# Altium footprint library qfuse_pcb_lib.PcbLib: 37 footprints (part 3 of 3)
Each footprint in its own frame and in the unit in brackets; x right, y up, seen from the top. Pads: shape width x height; smd on the part's side, far side on the other; paste and mask are expansions set on the pad; w line width, h text height; cw(c..) or ccw(c..) is an arc to the next point about the centre after c.
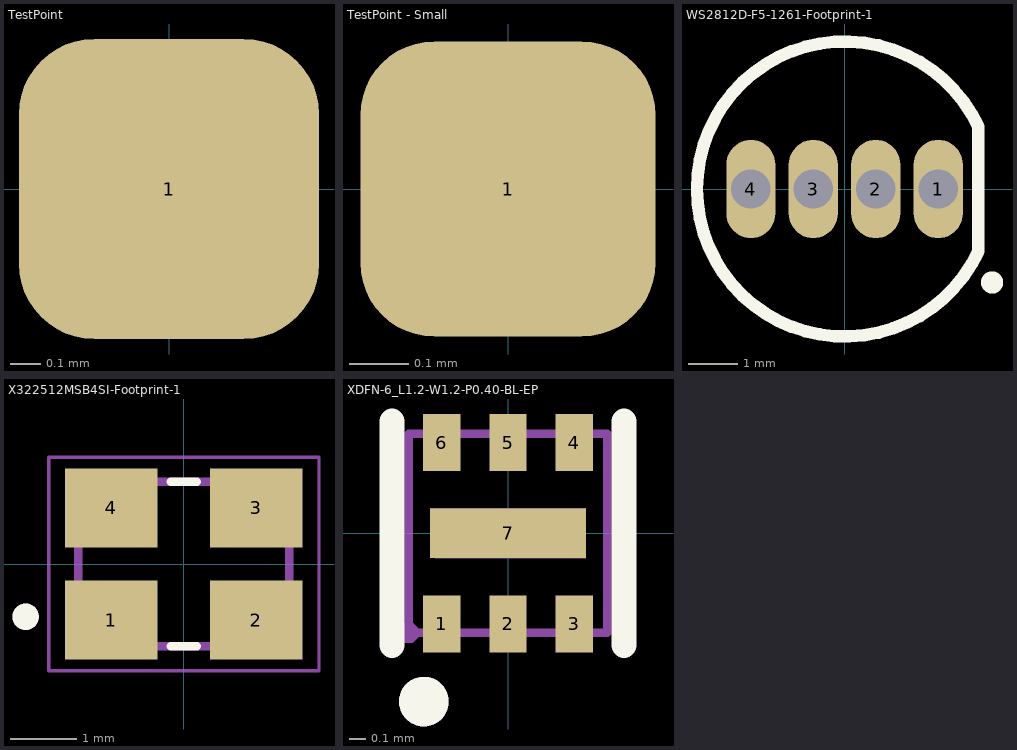
[diagram p2: the footprints below, top view; thin cyan lines are the x and y axes]

## TestPoint [mm]
pads (1):
  rrect50% 1x1 smd: 1(0,0)

## TestPoint - Small [mm]
pads (1):
  rrect50% 0.5x0.5 smd: 1(0,0)

## WS2812D-F5-1261-Footprint-1 [mm]
pads (4):
  oval 1x2 hole 0.8: 1(1.905,0) 2(0.635,0) 3(-0.635,0) 4(-1.905,0)
Top Overlay:
  circle w0.254: c3,-1.9 r0.1
  lines w0.254: 2.719,-1.268 cw(c0,0) 2.719,1.268 2.719,-1.268
Top Solder:
  rectangle: -2.259,-0.854 2.259,0.854
3D body "CA GRB LED 5mm.STEP": height 8.6, standoff -25.6, extent -2.75,-2.75 2.375,2.75

## X322512MSB4SI-Footprint-1 [mm]
pads (4):
  rect 1.4x1.2 smd: 1(-1.1,-0.85) 2(1.1,-0.85) 3(1.1,0.85) 4(-1.1,0.85)
Top Overlay:
  circle w0.2: c-2.4,-0.8 r0.1
  lines w0.127: -0.2,-1.25 0.2,-1.25 ; -0.2,1.25 0.2,1.25
Mechanical 13:
  circle w0.2: c-2.4,-0.8 r0.1
  lines w0.127: -1.6,-1.25 -1.6,1.25 1.6,1.25 1.6,-1.25 -1.6,-1.25
Mechanical 15:
  lines w0.05: -2.05,-1.62 -2.05,1.62 2.05,1.62 2.05,-1.62 -2.05,-1.62
3D body "TSX-3225 16.0000MF18X-AC3--3DModel-STEP-56544.STEP": height 0.6, standoff 0, extent -1.6,-1.25 1.6,1.25

## XDFN-6_L1.2-W1.2-P0.40-BL-EP [mm]
pads (7):
  rect 0.224x0.345 smd paste+0 mask+0.035: 1(-0.4,-0.547) 2(0,-0.547) 3(0.4,-0.547) 4(0.4,0.547) 5(0,0.547) 6(-0.4,0.547)
  rect 0.94x0.3 smd paste+0 mask+0.051: 7(0,0)
Top Overlay:
  circle w0.15: c-0.508,-1.016 r0.075
  lines w0.152: -0.7,-0.676 -0.7,0.676 ; 0.7,-0.676 0.7,0.676
Mechanical 6:
  circle w0.15: c-0.508,-1.016 r0.075
Mechanical 15:
  region: -0.54,-0.6 -0.54,-0.575 -0.575,-0.54 -0.625,-0.54 -0.66,-0.575 -0.66,-0.6 -0.66,-0.625 -0.625,-0.66 -0.575,-0.66 -0.54,-0.625
  region: -0.49,-0.6 -0.49,-0.4 -0.31,-0.4 -0.31,-0.6
  region: -0.09,-0.6 -0.09,-0.4 0.09,-0.4 0.09,-0.6
  region: 0.31,-0.6 0.31,-0.4 0.49,-0.4 0.49,-0.6
  region: 0.31,0.6 0.31,0.4 0.49,0.4 0.49,0.6
  region: -0.09,0.6 -0.09,0.4 0.09,0.4 0.09,0.6
  region: -0.49,0.6 -0.49,0.4 -0.31,0.4 -0.31,0.6
  region: -0.47,-0.12 -0.47,0.15 0.47,0.15 0.47,-0.15 -0.44,-0.15
  lines w0.051: -0.6,-0.6 -0.6,0.6 0.6,0.6 0.6,-0.6 -0.6,-0.6
3D body "XDFN6_1P25X1P25_ONS.step": height 0.46, standoff 0, extent -0.597,-0.648 0.597,0.648